# Altium footprint library SMD Component.PcbLib: 161 footprints (part 5 of 11)
Each footprint in its own frame and in the unit in brackets; x right, y up, seen from the top. Pads: shape width x height; smd on the part's side, far side on the other; paste and mask are expansions set on the pad; w line width, h text height; cw(c..) or ccw(c..) is an arc to the next point about the centre after c.
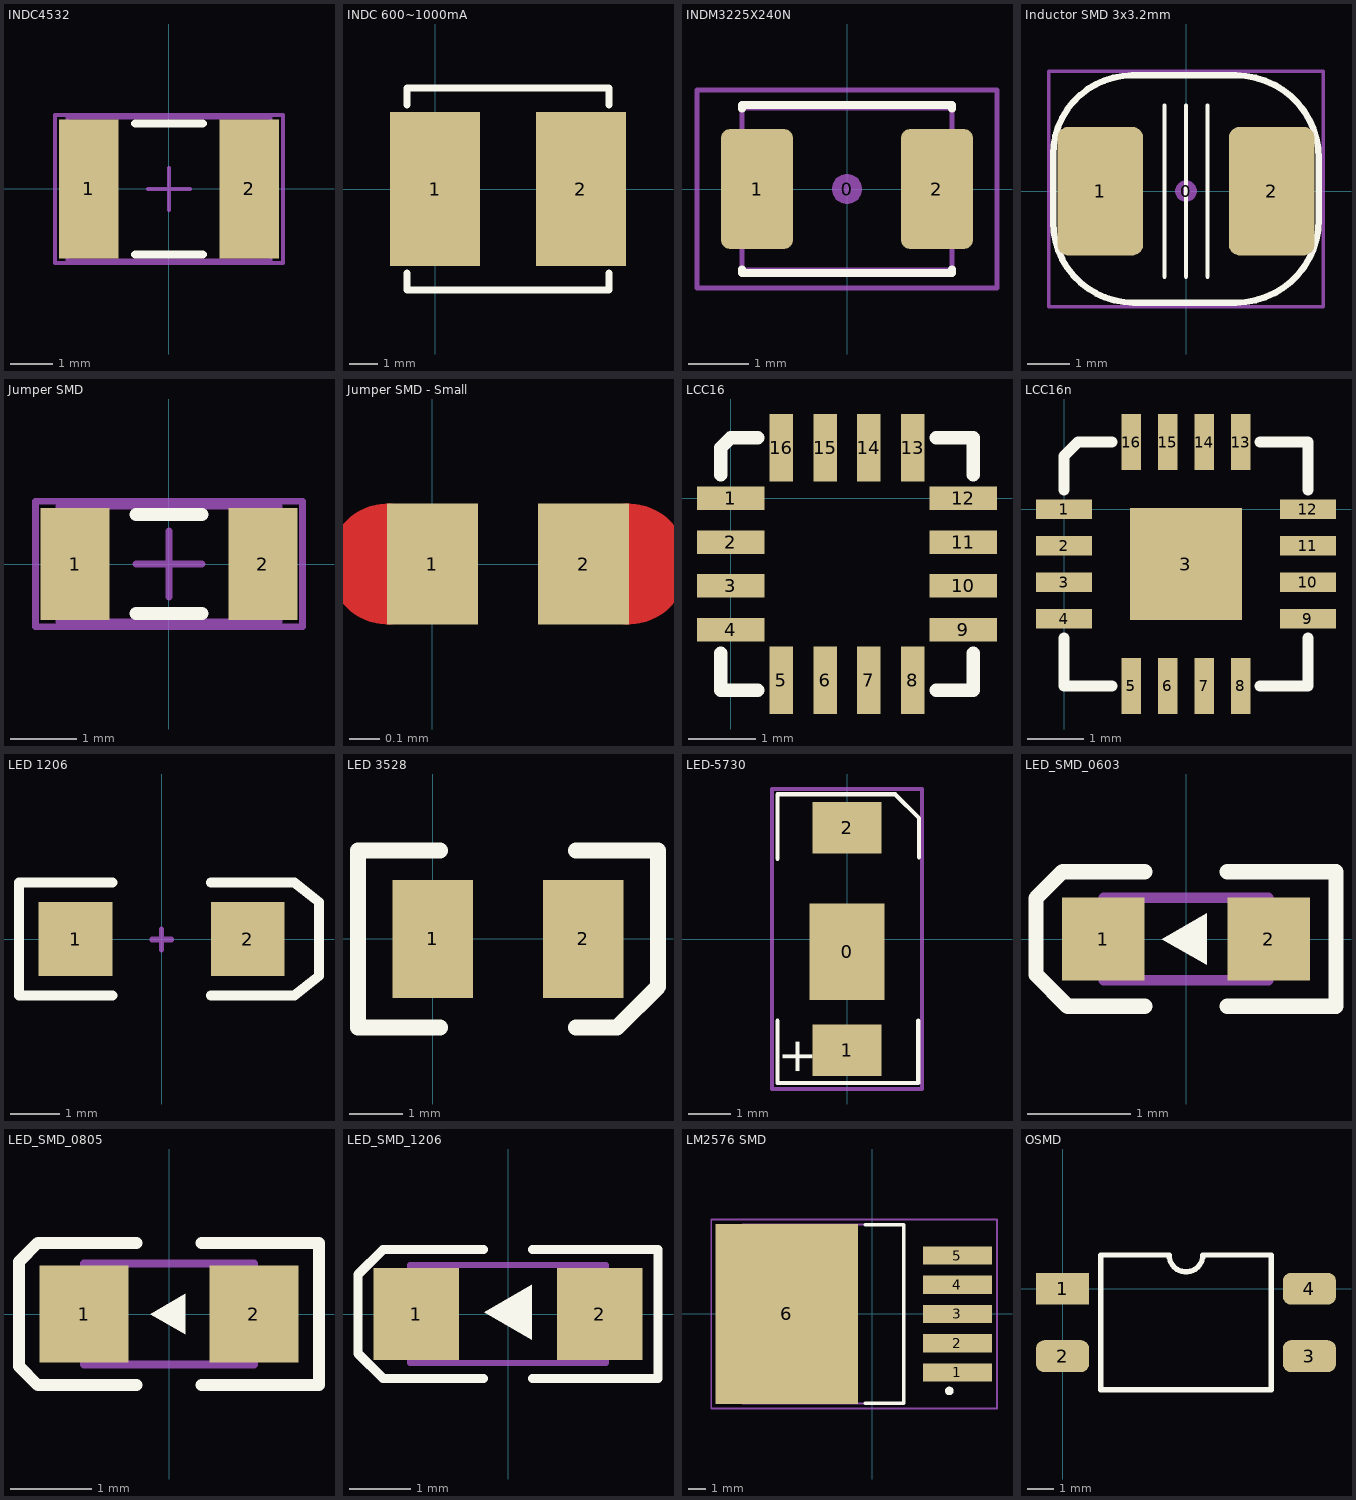
[diagram p4: the footprints below, top view; thin cyan lines are the x and y axes]

## INDC4532 [mm] "Chip Inductor, Body 4.5x3.2mm, IPC High Density"
height 0.55
pads (2):
  rect 1.4x3.3 smd: 1(-1.9,0) 2(1.9,0)
Top Overlay:
  lines w0.2: -0.8,-1.55 0.8,-1.55 ; -0.8,1.55 0.8,1.55
Mechanical 13:
  lines w0.1: -2.4,-1.7 -2.4,1.7 2.4,1.7 2.4,-1.7 -2.4,-1.7
Mechanical 15:
  lines w0.1: -0.5,0 0.5,0 ; 0,-0.5 0,0.5 ; -2.7,-1.75 -2.7,1.75 2.7,1.75 2.7,-1.75 -2.7,-1.75
3D body "INDC4532X175N.STEP": height 1.75, standoff 0, extent -2.25,-1.6 2.25,1.6

## INDC 600~1000mA [mm]
pads (2):
  rect 3.2x5.5 smd: 1(0,0) 2(5.2,0)
Top Overlay:
  lines w0.254: -1,-3 -1,-3.6 6.2,-3.6 6.2,-3 ; -1,3 -1,3.6 6.2,3.6 6.2,3

## INDM3225X240N [mm] "Molded Inductor, 2-Leads, Body 3.2x2.5mm, IPC Medium Density"
height 2.4
pads (3):
  round 0.508 on Mech15: 0(0,0)
  rrect25% 1.2x2 smd: 1(-1.5,0) 2(1.5,0)
Top Overlay:
  lines w0.127: -1.75,-1.338 -1.75,-1.4 1.75,-1.4 1.75,-1.338 ; -1.75,1.338 -1.75,1.4 1.75,1.4 1.75,1.338
Mechanical 13:
  lines w0.076: -1.75,-1.35 1.75,-1.35 1.75,1.35 -1.75,1.35 -1.75,-1.35
Mechanical 15:
  lines w0.076: -2.5,-1.65 2.5,-1.65 2.5,1.65 -2.5,1.65 -2.5,-1.65
3D body "INDM3225X240N.STEP": height 2.4, standoff 0, extent -1.79,-1.35 1.79,1.35

## Inductor SMD 3x3.2mm [mm] "Inductor 4.7µH SMD 3x3.2mm"
pads (3):
  round 0.508 on Mech15: 0(0,0)
  rrect25% 2x3 smd: 1(-2,0) 2(2,0)
Top Overlay:
  lines w0.1: -0.5,-2 -0.5,2 ; 0,-2 0,2 ; 0.5,-2 0.5,2
  lines w0.15: -3.1,-0.725 ccw(c-1.225,-0.725) -1.225,-2.6 1.165,-2.6 ccw(c1.165,-0.665) 3.1,-0.665 3.1,0.765 ccw(c1.165,0.765) 1.165,2.7 -1.252,2.7 ccw(c-1.252,0.852) -3.1,0.852 -3.1,-0.725
Mechanical 15:
  lines w0.076: -3.2,-2.7 3.2,-2.7 3.2,2.8 -3.2,2.8 -3.2,-2.7
3D body "smd self 4.7uH.stp": height 4.5, standoff 0, extent -2.899,-2.6 2.889,2.6

## Jumper SMD [mm]
pads (2):
  rect 1.05x1.7 smd: 1(-1.425,0) 2(1.425,0)
Top Overlay:
  lines w0.2: -0.5,-0.75 0.5,-0.75 ; -0.5,0.75 0.5,0.75
Mechanical 13:
  lines w0.1: -1.675,-0.875 1.675,-0.875 1.675,0.875 -1.675,0.875 -1.675,-0.875
Mechanical 15:
  lines w0.1: -0.5,0 0.5,0 ; 0,-0.5 0,0.5 ; -2.025,-0.95 2.025,-0.95 2.025,0.95 -2.025,0.95 -2.025,-0.95

## Jumper SMD - Small [mm]
pads (2):
  rect 0.3x0.4 smd paste+0 mask+0: 1(0,0) 2(0.5,0)
Top Layer:
  lines w0.2: -0.144,-0.1 cw(c-0.146,0) -0.144,0.1 ; 0.644,-0.1 ccw(c0.646,0) 0.644,0.1
Top Solder:
  rectangle: -0.15,-0.2 0.65,0.2
  lines w0.2: -0.144,-0.1 cw(c-0.146,0) -0.144,0.1 ; 0.644,-0.1 ccw(c0.646,0) 0.644,0.1

## LCC16 [mm]
pads (16):
  rect 1x0.35 smd: 1(0,0) 2(0,-0.65) 3(0,-1.3) 4(0,-1.95) 9(3.45,-1.95) 10(3.45,-1.3) 11(3.45,-0.65) 12(3.45,0)
  rect 0.35x1 smd: 5(0.75,-2.7) 6(1.4,-2.7) 7(2.05,-2.7) 8(2.7,-2.7) 13(2.7,0.75) 14(2.05,0.75) 15(1.4,0.75) 16(0.75,0.75)
Top Overlay:
  lines w0.2: -0.15,-2.3 -0.15,-2.85 0.4,-2.85 ; -0.15,0.35 -0.15,0.75 0,0.9 0.4,0.9 ; 3.05,-2.85 3.6,-2.85 3.6,-2.3 ; 3.05,0.9 3.6,0.9 3.6,0.35

## LCC16n [mm]
pads (17):
  rect 1x0.35 smd: 1(0,0) 2(0,-0.65) 3(0,-1.3) 4(0,-1.95) 9(4.35,-1.95) 10(4.35,-1.3) 11(4.35,-0.65) 12(4.35,0)
  rect 2x2 smd mask+0.025: 3(2.175,-0.975)
  rect 0.35x1 smd: 5(1.2,-3.15) 6(1.85,-3.15) 7(2.5,-3.15) 8(3.15,-3.15) 13(3.15,1.2) 14(2.5,1.2) 15(1.85,1.2) 16(1.2,1.2)
Top Overlay:
  lines w0.2: 0,-2.3 0,-3.15 0.85,-3.15 ; 0,0.35 0,0.95 0.25,1.2 0.85,1.2 ; 3.5,-3.15 4.35,-3.15 4.35,-2.3 ; 3.5,1.2 4.35,1.2 4.35,0.35

## LED 1206 [mm]
pads (2):
  rect 1.5x1.5 smd: 1(-1.75,0) 2(1.75,0)
Top Overlay:
  lines w0.2: -1,-1.15 -2.9,-1.15 -2.9,1.15 -1,1.15 ; 1,-1.15 2.7,-1.15 3.2,-0.75 3.2,0.75 2.7,1.15 1,1.15
Mechanical 1:
  lines w0.1: -0.2,-0.025 0.2,-0.025 ; -0.2,0 0.2,0 ; 0,-0.225 0,0.175 ; 0,-0.2 0,0.2
3D body "SW3dPS-LED_SMD_SML010L_Red.STEP": height 1.36, standoff 0.01, extent -1.65,-0.722 1.65,0.728

## LED 3528 [mm]
pads (2):
  rect 1.5x2.2 smd: 1(0,0) 2(2.8,0)
Top Overlay:
  lines w0.3: 0.13,-1.653 -1.394,-1.653 -1.394,1.649 0.13,1.649 ; 2.67,-1.653 3.429,-1.653 4.194,-0.888 4.194,1.649 2.67,1.649
3D body "User Library-3528.step": height 1.8, standoff 0, extent -0.35,-1.41 3.15,1.39

## LED-5730 [mm] "LED; 2 Leads"
pads (3):
  rect 1.75x2.25 smd: 0(0,-0.3)
  rect 1.6x1.2 smd: 1(0,-2.6) 2(0,2.6)
Top Overlay:
  lines w0.1: -1.62,-1.905 -1.62,-3.36 1.665,-3.36 1.665,-1.905 ; -1.62,1.875 -1.62,3.375 1.125,3.375 1.68,2.82 1.68,2.61 1.68,1.905
  text "+" at -0.8,-3.2 h0.8
Mechanical 15:
  lines w0.1: -0.25,0 0.25,0 ; 0,-0.25 0,0.25 ; -1.75,-3.5 -1.75,3.5 1.75,3.5 1.75,-3.5 -1.75,-3.5
3D body "User Library-LED-midPower.STEP": height 0.76, standoff 0, extent -1.5,-2.8 1.5,2.8

## LED_SMD_0603 [mm] "SMD Mono-color Chip LED, body 1.6x0.8mm"
height 0.7
pads (2):
  rect 0.8x0.8 smd: 1(-0.8,0) 2(0.8,0)
Top Overlay:
  region: -0.233,0 0.2,-0.25 0.2,0.25
  lines w0.15: -0.4,-0.654 -1.146,-0.654 -1.454,-0.346 -1.454,0.396 -1.196,0.654 -0.4,0.654 ; 0.4,-0.654 1.454,-0.654 1.454,0.654 0.4,0.654
Mechanical 13:
  lines w0.1: -0.8,-0.4 0.8,-0.4 0.8,0.4 -0.8,0.4 -0.8,-0.4
3D body "WL-SMCW_0603_LED.stp": height 0.7, standoff 0, extent -0.8,-0.4 0.8,0.4

## LED_SMD_0805 [mm] "SMD Mono-color Chip LED, body 2.0x1.25mm"
height 0.7
pads (2):
  rect 1.1x1.2 smd: 1(-1.05,0) 2(1.05,0)
Top Overlay:
  region: -0.233,0 0.2,-0.25 0.2,0.25
  lines w0.15: -0.4,-0.879 -1.621,-0.879 -1.854,-0.646 -1.854,0.646 -1.621,0.879 -0.4,0.879 ; 0.4,-0.879 1.854,-0.879 1.854,0.879 0.4,0.879
Mechanical 13:
  lines w0.1: -1.05,-0.625 1.05,-0.625 1.05,0.625 -1.05,0.625 -1.05,-0.625
3D body "WL-SMCW_0805_LED.stp": height 0.7, standoff 0, extent -1,-0.625 1,0.625

## LED_SMD_1206 [mm] "SMD Mono-color Chip LED, body 3.2x1.6mm"
height 0.68
pads (2):
  rect 1.4x1.5 smd: 1(-1.5,0) 2(1.5,0)
Top Overlay:
  region: -0.39,0.025 0.39,0.475 0.39,-0.425
  lines w0.15: -0.4,-1.054 -2.046,-1.054 -2.454,-0.646 -2.454,0.646 -2.046,1.054 -0.4,1.054 ; 0.4,-1.054 2.454,-1.054 2.454,1.054 0.4,1.054
Mechanical 13:
  lines w0.1: -1.6,-0.8 -1.6,0.8 1.6,0.8 1.6,-0.8 -1.6,-0.8
3D body "WL-SMCW_1206_LED.stp": height 0.68, standoff 0, extent -1.6,-0.8 1.6,0.8

## LM2576 SMD [mm]
pads (6):
  rect 4x1.05 smd: 1(4.962,-3.4) 2(4.962,-1.7) 3(4.962,0) 4(4.962,1.7) 5(4.962,3.4)
  rect 8.3x10.45 smd: 6(-4.963,0)
Top Overlay:
  circle w0.25: c4.487,-4.475 r0.125
  lines w0.2: -0.413,-5.2 1.837,-5.2 1.837,5.2 -0.413,5.2
Mechanical 13:
  lines w0.1: -7.563,-5.2 1.837,-5.2 1.837,5.2 -7.563,5.2 -7.563,-5.2
Mechanical 15:
  lines w0.1: -9.363,-5.5 7.263,-5.5 7.263,5.5 -9.363,5.5 -9.363,-5.5
3D body: height 4.65, standoff 0, extent -7.563,-5.2 1.837,5.2

## OSMD [mm] "OPTOSMD"
pads (4):
  rect 2x1.2 smd: 1(0,0)
  rrect50% 2x1.2 smd: 2(0,-2.54) 3(9.3,-2.54) 4(9.3,0)
Top Overlay:
  lines w0.2: 1.435,-3.81 1.435,1.27 4.015,1.27 ccw(c4.65,1.27) 5.285,1.27 7.865,1.27 7.865,-3.81 1.435,-3.81